# Altium footprint library devices.PCBLIB: 335 footprints (part 5 of 21)
Each footprint in its own frame and in the unit in brackets; x right, y up, seen from the top. Pads: shape width x height; smd on the part's side, far side on the other; paste and mask are expansions set on the pad; w line width, h text height; cw(c..) or ccw(c..) is an arc to the next point about the centre after c.
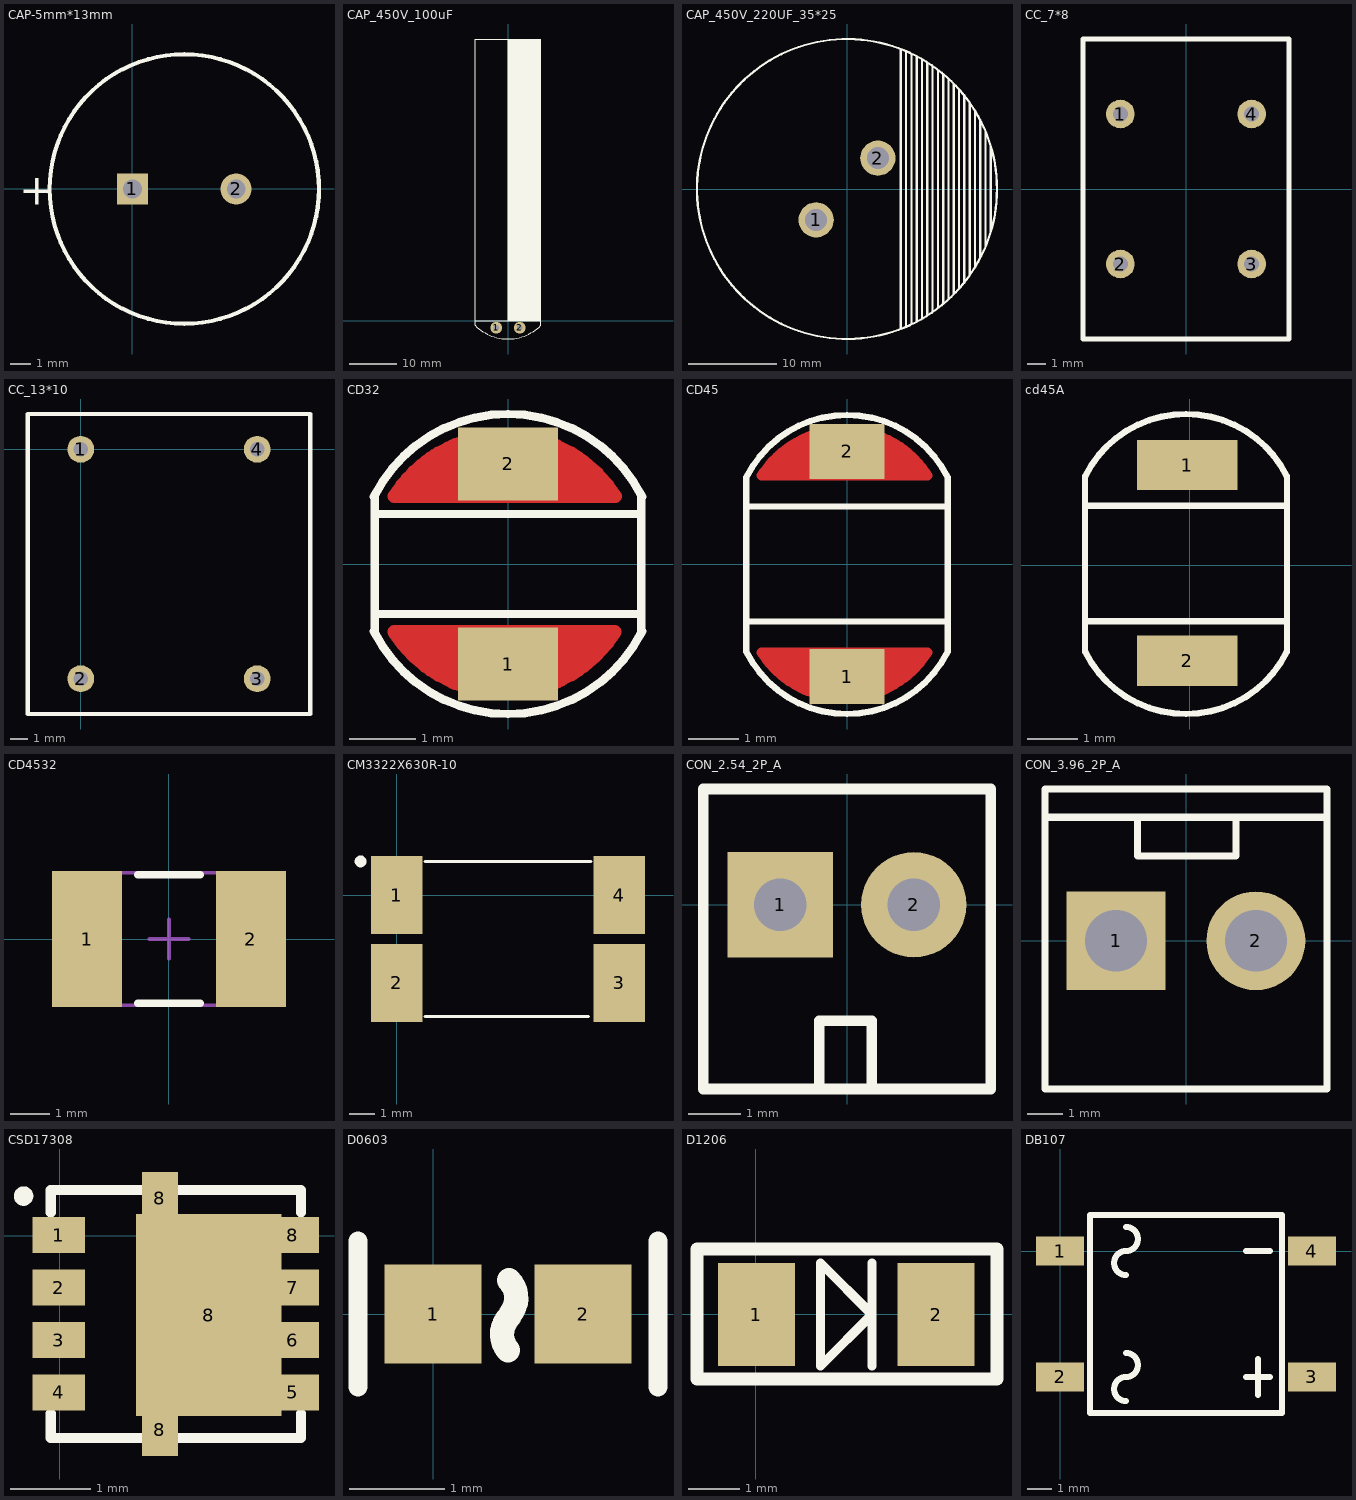
[diagram p4: the footprints below, top view; thin cyan lines are the x and y axes]

## CAP-5mm*13mm [mm]
pads (2):
  rect 1.5x1.5 hole 0.9: 1(0,0)
  round 1.5 hole 0.9: 2(5,0)
Top Overlay:
  circle w0.2: c2.5,0 r6.5
  text "+" at -5.475,-0.75 h1.5

## CAP_450V_100uF [mm]
pads (2):
  round 2.5 hole 1.2: 1(-2.5,-1.5) 2(2.5,-1.5)
Top Overlay:
  rectangle: 0,0 7,60
  lines w0.254: 0,0 0,60 ; -7,0 -7,-1 ccw(c0,6) 7,-1 7,0 ; -7,0 -7,60 7,60 7,0 ; -7,0 7,0

## CAP_450V_220UF_35*25 [mm]
pads (2):
  round 4 hole 2.5: 1(-3.5,-3.5) 2(3.5,3.5)
Top Overlay:
  circle w0.254: c0,0 r17
  lines w0.254: 6.1,-15.8 6.1,15.8 ; 6.7,-15.6 6.7,15.6 ; 7.3,-15.3 7.3,15.3 ; 7.9,-15 7.9,15 ; 8.5,-14.7 8.5,14.7 ; 9.1,-14.3 9.1,14.3 ; 9.7,-13.9 9.7,13.9 ; 10.3,-13.5 10.3,13.5 ; 10.9,-13 10.9,13 ; 11.5,-12.5 11.5,12.5 ; 12.1,-11.9 12.1,11.9 ; 12.7,-11.3 12.7,11.3 ; 13.3,-10.6 13.3,10.5 ; 13.9,-9.7 13.9,9.7 ; 14.5,-8.8 14.5,8.8 ; 15.1,-7.7 15.1,7.8 ; 15.7,-6.5 15.7,6.4 ; 16.3,-4.8 16.3,4.8

## CC_7*8 [mm]
pads (4):
  round 1.524 hole 0.8: 1(-3.5,4) 2(-3.5,-4) 3(3.5,-4) 4(3.5,4)
Top Overlay:
  lines w0.254: -5.5,-8 -5.5,8 5.5,8 5.5,-8 -5.5,-8

## CC_13*10 [mm]
pads (4):
  round 1.524 hole 0.8: 1(0,0) 2(0,-13) 3(10,-13) 4(10,0)
Top Overlay:
  lines w0.254: -3,-15 13,-15 13,2 -3,2 -3,-15

## CD32 [mm]
pads (2):
  rect 1.5x1.1 smd: 1(0,-1.5) 2(0,1.5)
Top Layer:
  lines w0.203: -1.594,-1.177 1.492,-1.177 ; -1.592,1.177 1.494,1.177 ; -1.51,1.018 -1.51,1.277 ; -1.435,-1.358 -1.435,-1.018 ; -1.412,-1.381 1.31,-1.381 ; -1.41,1.381 1.312,1.381 ; -1.306,1.018 -1.306,1.474 ; -1.232,-1.535 -1.232,-1.018 ; -1.165,-1.584 1.063,-1.584 ; -1.163,1.584 1.065,1.584 ; -1.103,1.018 -1.103,1.623 ; -1.029,-1.67 -1.029,-1.018 ; -0.9,1.018 -0.9,1.737 ; -0.826,-1.772 -0.826,-1.018 ; -0.79,-1.787 0.688,-1.787 ; -0.788,1.787 0.69,1.787 ; -0.697,1.018 -0.697,1.821 ; -0.622,-1.846 -0.622,-1.018 ; -0.494,1.018 -0.494,1.881 ; -0.419,-1.897 -0.419,-1.018 ; -0.29,1.018 -0.29,1.917 ; -0.216,-1.925 -0.216,-1.018 ; -0.087,1.018 -0.087,1.931 ; -0.013,-1.931 -0.013,-1.018 ; 0.116,1.018 0.116,1.925 ; 0.19,-1.917 0.19,-1.018 ; 0.319,1.018 0.319,1.897 ; 0.394,-1.881 0.394,-1.018 ; 0.522,1.018 0.522,1.846 ; 0.597,-1.821 0.597,-1.018 ; 0.726,1.018 0.726,1.772 ; 0.8,-1.737 0.8,-1.018 ; 0.929,1.018 0.929,1.67 ; 1.003,-1.623 1.003,-1.018 ; 1.132,1.018 1.132,1.535 ; 1.206,-1.474 1.206,-1.018 ; 1.335,1.018 1.335,1.358 ; 1.41,-1.277 1.41,-1.018 ; -1.706,-1.018 ccw(c-0.051,0.024) 1.604,-1.018 -1.706,-1.018 ; -1.704,1.018 cw(c-0.049,-0.024) 1.606,1.018 -1.704,1.018
Top Overlay:
  lines w0.127: -2.012,-1.006 ccw(c0,0) 2.012,-1.006 ; -2.012,1.006 cw(c0,0) 2.012,1.006 ; -2,-1 -2,1 ; -2,-0.75 2,-0.75 ; -2,0.75 2,0.75 ; 2,-1 2,1
Top Solder:
  lines w0.203: -1.903,-1.11 1.877,-1.11 ; -1.903,1.11 1.877,1.11 ; -1.803,1 -1.803,1.209 ; -1.699,-1.313 1.674,-1.313 ; -1.7,1.313 1.674,1.313 ; -1.676,-1.336 -1.676,-1 ; -1.6,1 -1.6,1.413 ; -1.496,-1.516 1.471,-1.516 ; -1.496,1.516 1.471,1.516 ; -1.473,-1.539 -1.473,-1 ; -1.397,1 -1.397,1.616 ; -1.293,-1.72 1.267,-1.72 ; -1.293,1.72 1.267,1.72 ; -1.27,-1.741 -1.27,-1 ; -1.194,1 -1.194,1.808 ; -1.067,-1.905 -1.067,-1 ; -1.04,-1.923 1.015,-1.923 ; -1.04,1.923 1.015,1.923 ; -0.991,1 -0.991,1.955 ; -0.864,-2.027 -0.864,-1 ; -0.787,1 -0.787,2.065 ; -0.66,-2.118 -0.66,-1 ; -0.638,2.126 0.613,2.126 ; -0.638,-2.126 0.613,-2.126 ; -0.584,1 -0.584,2.145 ; -0.457,-2.181 -0.457,-1 ; -0.381,1 -0.381,2.198 ; -0.254,-2.219 -0.254,-1 ; -0.178,1 -0.178,2.228 ; -0.051,-2.235 -0.051,-1 ; 0.025,1 0.025,2.235 ; 0.152,-2.228 0.152,-1 ; 0.229,1 0.229,2.219 ; 0.356,-2.198 0.356,-1 ; 0.432,1 0.432,2.181 ; 0.559,-2.145 0.559,-1 ; 0.635,1 0.635,2.118 ; 0.762,-2.065 0.762,-1 ; 0.838,1 0.838,2.027 ; 0.965,-1.955 0.965,-1 ; 1.041,1 1.041,1.905 ; 1.168,-1.808 1.168,-1 ; 1.245,1 1.245,1.741 ; 1.372,-1.616 1.372,-1 ; 1.448,1 1.448,1.539 ; 1.575,-1.413 1.575,-1 ; 1.651,1 1.651,1.336 ; 1.778,-1.209 1.778,-1 ; -2.013,-1 -1.318,-1.694 ccw(c-0.013,-0.389) -0.013,-2.235 ccw(c-0.013,-0.389) 1.293,-1.694 1.987,-1 -2.013,-1 ; -2.013,1 -1.318,1.694 cw(c-0.013,0.389) -0.013,2.235 cw(c-0.013,0.389) 1.293,1.694 1.987,1 -2.013,1

## CD45 [mm]
height 6.86
pads (2):
  rect 1.5x1.1 smd: 1(0,-2.25) 2(0,2.25)
Top Layer:
  lines w0.203: -1.594,-1.927 1.492,-1.927 ; -1.51,1.768 -1.51,2.027 ; -1.435,-2.108 -1.435,-1.768 ; -1.412,-2.131 1.31,-2.131 ; -1.306,1.768 -1.306,2.224 ; -1.232,-2.285 -1.232,-1.768 ; -1.165,-2.334 1.063,-2.334 ; -1.103,1.768 -1.103,2.373 ; -1.029,-2.42 -1.029,-1.768 ; -0.9,1.768 -0.9,2.487 ; -0.826,-2.522 -0.826,-1.768 ; -0.79,-2.537 0.688,-2.537 ; -0.697,1.768 -0.697,2.571 ; -0.622,-2.596 -0.622,-1.768 ; -0.494,1.768 -0.494,2.631 ; -0.419,-2.647 -0.419,-1.768 ; -0.29,1.768 -0.29,2.667 ; -0.216,-2.675 -0.216,-1.768 ; -0.087,1.768 -0.087,2.681 ; -0.013,-2.681 -0.013,-1.768 ; 0.116,1.768 0.116,2.675 ; 0.19,-2.667 0.19,-1.768 ; 0.319,1.768 0.319,2.647 ; 0.394,-2.631 0.394,-1.768 ; 0.522,1.768 0.522,2.596 ; 0.597,-2.571 0.597,-1.768 ; 0.726,1.768 0.726,2.522 ; 0.8,-2.487 0.8,-1.768 ; 0.929,1.768 0.929,2.42 ; 1.003,-2.373 1.003,-1.768 ; 1.132,1.768 1.132,2.285 ; 1.206,-2.224 1.206,-1.768 ; 1.335,1.768 1.335,2.108 ; 1.41,-2.027 1.41,-1.768 ; -1.592,1.927 ccw(c-0.049,0.726) -1.704,1.768 1.606,1.768 ccw(c-0.049,0.726) 1.494,1.927 ; -1.592,1.927 cw(c-0.049,0.726) -1.51,2.027 ; -1.592,1.927 1.494,1.927 ; -1.51,2.027 cw(c-0.049,0.726) -1.41,2.131 ; -1.41,2.131 cw(c-0.049,0.726) -1.306,2.224 ; -1.41,2.131 1.312,2.131 ; -1.306,2.224 cw(c-0.049,0.726) -1.163,2.334 ; -1.163,2.334 cw(c-0.049,0.726) -1.103,2.373 ; -1.163,2.334 1.065,2.334 ; -1.103,2.373 cw(c-0.049,0.726) -0.9,2.487 ; -0.9,2.487 cw(c-0.049,0.726) -0.788,2.537 ; -0.788,2.537 cw(c-0.049,0.726) -0.697,2.571 ; -0.788,2.537 0.69,2.537 ; -0.697,2.571 cw(c-0.049,0.726) -0.494,2.631 ; -0.494,2.631 cw(c-0.049,0.726) -0.29,2.667 ; -0.29,2.667 cw(c-0.049,0.726) -0.087,2.681 ; -0.087,2.681 cw(c-0.049,0.726) 0.116,2.675 ; 0.116,2.675 cw(c-0.049,0.726) 0.319,2.647 ; 0.319,2.647 cw(c-0.049,0.726) 0.522,2.596 ; 0.522,2.596 cw(c-0.049,0.726) 0.69,2.537 ; 0.69,2.537 cw(c-0.049,0.726) 0.726,2.522 ; 0.726,2.522 cw(c-0.049,0.726) 0.929,2.42 ; 0.929,2.42 cw(c-0.049,0.726) 1.065,2.334 ; 1.065,2.334 cw(c-0.049,0.726) 1.132,2.285 ; 1.132,2.285 cw(c-0.049,0.726) 1.312,2.131 ; 1.312,2.131 cw(c-0.049,0.726) 1.335,2.108 ; 1.335,2.108 cw(c-0.049,0.726) 1.494,1.927 ; -1.706,-1.768 ccw(c-0.051,-0.726) 1.604,-1.768 -1.706,-1.768
Top Overlay:
  lines w0.127: -2,-1.15 2,-1.15 ; -2,1.15 2,1.15 ; -2.012,-1.756 ccw(c0,-0.75) 2.012,-1.756 2.012,1.738 ccw(c0,0.731) -2.012,1.738 -2.012,-1.756
Top Solder:
  lines w0.203: -1.903,-1.86 1.877,-1.86 ; -1.903,1.81 1.877,1.81 ; -1.803,1.7 -1.803,1.909 ; -1.699,-2.063 1.674,-2.063 ; -1.7,2.013 1.674,2.013 ; -1.676,-2.086 -1.676,-1.75 ; -1.6,1.7 -1.6,2.113 ; -1.496,-2.266 1.471,-2.266 ; -1.496,2.216 1.471,2.216 ; -1.473,-2.289 -1.473,-1.75 ; -1.397,1.7 -1.397,2.316 ; -1.293,-2.47 1.267,-2.47 ; -1.293,2.42 1.267,2.42 ; -1.27,-2.491 -1.27,-1.75 ; -1.194,1.7 -1.194,2.508 ; -1.067,-2.655 -1.067,-1.75 ; -1.04,-2.673 1.015,-2.673 ; -1.04,2.623 1.015,2.623 ; -0.991,1.7 -0.991,2.655 ; -0.864,-2.777 -0.864,-1.75 ; -0.787,1.7 -0.787,2.765 ; -0.66,-2.868 -0.66,-1.75 ; -0.638,2.826 0.613,2.826 ; -0.638,-2.876 0.613,-2.876 ; -0.584,1.7 -0.584,2.845 ; -0.457,-2.931 -0.457,-1.75 ; -0.381,1.7 -0.381,2.898 ; -0.254,-2.969 -0.254,-1.75 ; -0.178,1.7 -0.178,2.928 ; -0.051,-2.985 -0.051,-1.75 ; 0.025,1.7 0.025,2.935 ; 0.152,-2.978 0.152,-1.75 ; 0.229,1.7 0.229,2.919 ; 0.356,-2.948 0.356,-1.75 ; 0.432,1.7 0.432,2.881 ; 0.559,-2.895 0.559,-1.75 ; 0.635,1.7 0.635,2.818 ; 0.762,-2.815 0.762,-1.75 ; 0.838,1.7 0.838,2.727 ; 0.965,-2.705 0.965,-1.75 ; 1.041,1.7 1.041,2.605 ; 1.168,-2.558 1.168,-1.75 ; 1.245,1.7 1.245,2.441 ; 1.372,-2.366 1.372,-1.75 ; 1.448,1.7 1.448,2.239 ; 1.575,-2.163 1.575,-1.75 ; 1.651,1.7 1.651,2.036 ; 1.778,-1.959 1.778,-1.75 ; -2.013,-1.75 1.987,-1.75 1.293,-2.444 cw(c-0.013,-1.139) -0.013,-2.985 cw(c-0.013,-1.139) -1.318,-2.444 -2.013,-1.75 ; -2.013,1.7 1.987,1.7 1.293,2.394 ccw(c-0.013,1.089) -0.013,2.935 ccw(c-0.013,1.089) -1.318,2.394 -2.013,1.7

## cd45A [mm]
pads (2):
  rect 2x1 smd: 1(-0.05,2) 2(-0.05,-1.9)
Top Overlay:
  lines w0.127: -2.076,-1.113 1.924,-1.113 ; -2.076,1.187 1.924,1.187 ; -2.089,-1.719 ccw(c-0.076,-0.713) 1.936,-1.719 1.936,1.774 ccw(c-0.076,0.768) -2.089,1.774 -2.089,-1.719

## CD4532 [mm] "Chip Inductor, Body 4.5x3.2mm, IPC Low Density"
height 1.35
pads (2):
  rect 1.8x3.5 smd: 1(-2.1,0) 2(2.1,0)
Top Overlay:
  lines w0.2: -0.8,-1.65 0.8,-1.65 ; -0.8,1.65 0.8,1.65
Mechanical 13:
  lines w0.1: -2.4,-1.7 2.4,-1.7 2.4,1.7 -2.4,1.7 -2.4,-1.7
Mechanical 15:
  lines w0.1: -0.5,0 0.5,0 ; 0,-0.5 0,0.5
3D body: height 1.35, standoff 0, extent -2.4,-1.7 2.4,1.7

## CM3322X630R-10 [mm]
pads (4):
  rect 2x3 smd: 1(0,0) 2(0,-3.4) 3(8.6,-3.4) 4(8.6,0)
Top Overlay:
  circle w0.254: c-1.4,1.3 r0.1
  lines w0.127: 1.1,-4.7 7.4,-4.7 ; 1.1,1.3 7.5,1.3

## CON_2.54_2P_A [mm]
height 6.86
pads (2):
  rect 2x2 hole 1: 1(-1.27,0)
  round 2 hole 1: 2(1.27,0)
Top Overlay:
  lines w0.2: -0.53,-3.5 -0.53,-2.2 0.47,-2.2 0.47,-3.5 ; -2.73,-3.5 2.73,-3.5 2.73,2.2 -2.73,2.2 -2.73,-3.5

## CON_3.96_2P_A [mm]
height 6.86
pads (2):
  rect 2.8x2.8 hole 1.75: 1(-1.98,0)
  round 2.8 hole 1.75: 2(1.98,0)
Top Overlay:
  lines w0.2: -4,3.5 4,3.5 ; -1.38,3.5 -1.38,2.4 1.42,2.4 1.42,3.5 ; -4,-4.2 4,-4.2 4,4.3 -4,4.3 -4,-4.2

## CSD17308 [mm]
pads (11):
  rect 0.65x0.45 smd: 1(-0.01,0.008) 2(-0.01,-0.642) 3(-0.01,-1.292) 4(-0.01,-1.942) 5(2.886,-1.942) 6(2.886,-1.292) 7(2.886,-0.642) 8(2.886,0.008)
  rect 0.45x0.65 smd: 8(1.241,-2.405) 8(1.241,0.465)
  rect 1.8x2.5 smd: 8(1.845,-0.983)
Top Overlay:
  circle w0.127: c-0.447,0.491 r0.057
  lines w0.127: -0.111,-2.202 -0.111,-2.507 2.988,-2.507 2.988,-2.202 ; -0.111,0.287 -0.111,0.567 2.988,0.567 2.988,0.287

## D0603 [mil]
pads (2):
  rect 40x41 smd: 1(0,0) 2(62,0)
Top Overlay:
  lines w8: -31,-30 -31,30 ; 93,-30 93,30
  lines w10: 31,-15 cw(c38.86,-8.35) 31.58,-1.07 ; 31.42,13.93 cw(c24.14,6.65) 32,0

## D1206 [mm]
pads (2):
  rect 1.5x2 smd: 1(0.015,-0.01) 2(3.515,-0.01)
Top Overlay:
  lines w0.025: 1.265,0.99 1.265,0.99 ; 2.265,-0.01 2.265,-0.01
  lines w0.178: 2.265,-1.01 2.265,0.99 ; 1.265,-1.01 1.265,0.99 2.265,-0.01 1.265,-1.01
  lines w0.254: -1.143,-1.27 4.699,-1.27 4.699,1.27 -1.016,1.27 -1.143,1.27 -1.143,-1.27

## DB107 [mm]
pads (4):
  rect 2x1.2 smd: 1(0,0) 2(0,-5.25) 3(10.5,-5.25) 4(10.5,0)
Top Overlay:
  lines w0.254: 2.75,-6.25 cw(c2.75,-5.75) 2.75,-5.25 ccw(c2.75,-4.75) 2.75,-4.25 ; 2.75,-1 cw(c2.75,-0.5) 2.75,0 ccw(c2.75,0.5) 2.75,1 ; 7.75,-5.25 8.75,-5.25 ; 7.75,0 8.75,0 ; 8.25,-6 8.25,-4.5 ; 1.25,-6.75 9.25,-6.75 9.25,1.5 1.25,1.5 1.25,-6.75